# Altium footprint library TranDangKhoa-LIB.PcbLib: 1435 footprints (part 11 of 90)
Each footprint in its own frame and in the unit in brackets; x right, y up, seen from the top. Pads: shape width x height; smd on the part's side, far side on the other; paste and mask are expansions set on the pad; w line width, h text height; cw(c..) or ccw(c..) is an arc to the next point about the centre after c.
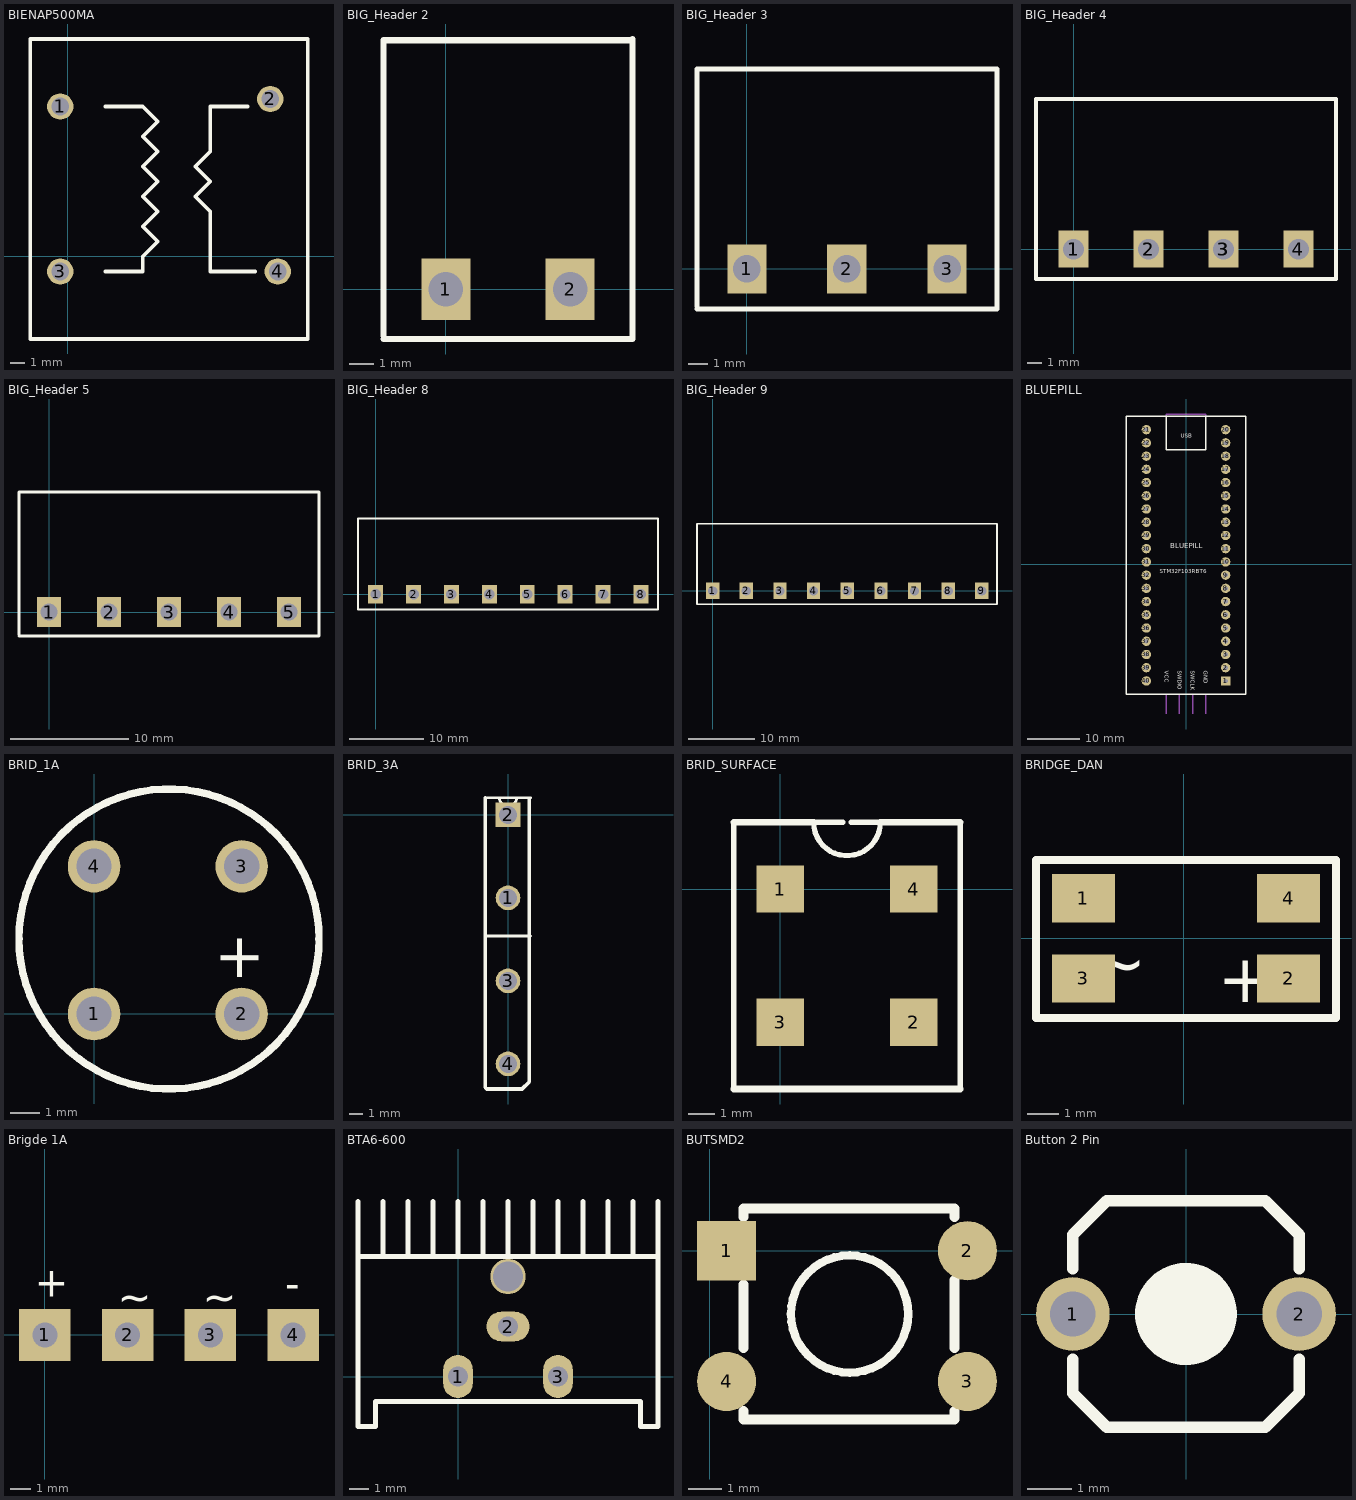
[diagram p10: the footprints below, top view; thin cyan lines are the x and y axes]

## BIENAP500MA [mil]
pads (4):
  round 70 hole 47.24 unplated: 1(-20,400) 2(540,420) 3(-20,-40) 4(560,-40)
Top Overlay:
  lines w10: 100,-40 200,-40 200,0 240,40 200,80 240,120 200,160 240,200 200,240 240,280 200,320 240,360 200,400 100,400 ; 480,400 380,400 380,280 340,240 380,200 340,160 380,120 380,-40 500,-40 ; -100,-220 640,-220 640,580 -100,580 -100,-220

## BIG_Header 2 [mm]
pads (2):
  rect 2x2.5 hole 1.4: 1(0,0) 2(5.08,0)
Top Overlay:
  lines w0.254: -2.54,-2.032 7.62,-2.032 7.62,10.211 ; -2.54,-1.905 -2.54,10.173 ; -2.54,10.16 7.62,10.16
3D body "User Library-BigHeader 5EHDR_1P.step": height 3.15, standoff -9.32, extent 2.58,-1.75 7.58,10.25
3D body "User Library-BigHeader 5EHDR_1P.step": height 3.15, standoff -9.32, extent -2.5,-1.75 2.5,10.25

## BIG_Header 3 [mm]
pads (3):
  rect 2x2.5 hole 1.4: 1(0,0) 2(5.08,0) 3(10.173,0)
Top Overlay:
  lines w0.254: -2.54,-2.032 12.713,-2.032 12.713,10.16 -2.54,10.16 -2.54,-1.905
3D body "User Library-BigHeader 5EHDR_1P.step": height 3.15, standoff -9.32, extent -2.5,-1.75 2.5,10.25
3D body "User Library-BigHeader 5EHDR_1P.step": height 3.15, standoff -9.32, extent 2.593,-1.75 7.593,10.25
3D body "User Library-BigHeader 5EHDR_1P.step": height 3.15, standoff -9.32, extent 7.673,-1.75 12.673,10.25

## BIG_Header 4 [mm]
pads (7):
  rect 2x2.5 hole 1.4: 1(0,0) 1(0,0) 2(5.08,0) 2(5.08,0) 3(10.16,0) 3(10.173,0) 4(15.24,0)
Top Overlay:
  lines w0.254: 12.713,-2.032 -2.54,-2.032 7.62,-2.032 17.78,-2.032 17.78,10.173 -2.527,10.173 -2.54,10.173 -2.54,-1.905 -2.54,10.16 ; 12.713,10.16 -2.54,10.16 ; 17.78,10.16 -2.54,10.16
3D body "User Library-BigHeader 5EHDR_1P.step": height 3.15, standoff -9.32, extent -2.5,-1.75 2.5,10.25
3D body "User Library-BigHeader 5EHDR_1P.step": height 3.15, standoff -9.32, extent 2.58,-1.75 7.58,10.25
3D body "User Library-BigHeader 5EHDR_1P.step": height 3.15, standoff -9.32, extent 7.66,-1.75 12.66,10.25
3D body "User Library-BigHeader 5EHDR_1P.step": height 3.15, standoff -9.32, extent 12.74,-1.75 17.74,10.25

## BIG_Header 5 [mm]
pads (5):
  rect 2x2.5 hole 1.4: 1(0,0) 2(5.08,0) 3(10.16,0) 4(15.24,0) 5(20.32,0)
Top Overlay:
  lines w0.254: -2.54,-2.032 7.62,-2.032 22.86,-2.032 22.86,10.16 ; -2.54,-1.905 -2.54,10.16 ; -2.54,10.16 22.86,10.16 ; -2.54,10.16 6.248,10.16 22.86,10.16
3D body "User Library-BigHeader 5EHDR_1P.step": height 3.15, standoff -9.32, extent -2.5,-1.75 2.5,10.25
3D body "User Library-BigHeader 5EHDR_1P.step": height 3.15, standoff -9.32, extent 2.58,-1.75 7.58,10.25
3D body "User Library-BigHeader 5EHDR_1P.step": height 3.15, standoff -9.32, extent 7.66,-1.75 12.66,10.25
3D body "User Library-BigHeader 5EHDR_1P.step": height 3.15, standoff -9.32, extent 12.74,-1.75 17.74,10.25
3D body "User Library-BigHeader 5EHDR_1P.step": height 3.15, standoff -9.32, extent 17.82,-1.75 22.82,10.25

## BIG_Header 8 [mm]
pads (8):
  rect 2x2.5 hole 1.4: 1(0,0) 2(5.08,0) 3(10.16,0) 4(15.24,0) 5(20.32,0) 6(25.4,0) 7(30.48,0) 8(35.56,0)
Top Overlay:
  lines w0.254: 13.843,10.16 37.846,10.16 37.846,-2.032 27.94,-2.032 17.78,-2.032 7.62,-2.032 -2.362,-2.032 -2.362,10.16 17.78,10.16
3D body "User Library-BigHeader 5EHDR_1P.step": height 3.15, standoff -9.32, extent -2.5,-1.75 2.5,10.25
3D body "User Library-BigHeader 5EHDR_1P.step": height 3.15, standoff -9.32, extent 2.58,-1.75 7.58,10.25
3D body "User Library-BigHeader 5EHDR_1P.step": height 3.15, standoff -9.32, extent 7.66,-1.75 12.66,10.25
3D body "User Library-BigHeader 5EHDR_1P.step": height 3.15, standoff -9.32, extent 12.74,-1.75 17.74,10.25
3D body "User Library-BigHeader 5EHDR_1P.step": height 3.15, standoff -9.32, extent 17.82,-1.75 22.82,10.25
3D body "User Library-BigHeader 5EHDR_1P.step": height 3.15, standoff -9.32, extent 22.9,-1.75 27.9,10.25
3D body "User Library-BigHeader 5EHDR_1P.step": height 3.15, standoff -9.32, extent 27.98,-1.75 32.98,10.25
3D body "User Library-BigHeader 5EHDR_1P.step": height 3.15, standoff -9.32, extent 33.06,-1.75 38.06,10.25

## BIG_Header 9 [mm]
pads (9):
  rect 2x2.5 hole 1.4: 1(0,0) 2(5.08,0) 3(10.16,0) 4(15.24,0) 5(20.32,0) 6(25.4,0) 7(30.48,0) 8(35.56,0) 9(40.64,0)
Top Overlay:
  lines w0.254: 13.843,10.16 42.926,10.16 42.926,-2.032 27.94,-2.032 17.78,-2.032 7.62,-2.032 -2.362,-2.032 -2.362,10.16 17.78,10.16
3D body "User Library-BigHeader 5EHDR_1P.step": height 3.15, standoff -9.32, extent -2.5,-1.75 2.5,10.25
3D body "User Library-BigHeader 5EHDR_1P.step": height 3.15, standoff -9.32, extent 2.58,-1.75 7.58,10.25
3D body "User Library-BigHeader 5EHDR_1P.step": height 3.15, standoff -9.32, extent 7.66,-1.75 12.66,10.25
3D body "User Library-BigHeader 5EHDR_1P.step": height 3.15, standoff -9.32, extent 12.74,-1.75 17.74,10.25
3D body "User Library-BigHeader 5EHDR_1P.step": height 3.15, standoff -9.32, extent 17.82,-1.75 22.82,10.25
3D body "User Library-BigHeader 5EHDR_1P.step": height 3.15, standoff -9.32, extent 22.9,-1.75 27.9,10.25
3D body "User Library-BigHeader 5EHDR_1P.step": height 3.15, standoff -9.32, extent 27.98,-1.75 32.98,10.25
3D body "User Library-BigHeader 5EHDR_1P.step": height 3.15, standoff -9.32, extent 33.06,-1.75 38.06,10.25
3D body "User Library-BigHeader 5EHDR_1P.step": height 3.15, standoff -9.32, extent 38.14,-1.75 43.14,10.25

## BLUEPILL [mm]
pads (40):
  rect 1.8x1.8 hole 0.8 paste-2539.97 mask+0.051: 1(7.622,-22.46)
  round 1.8 hole 0.8 paste-2539.97 mask+0.051: 2(7.62,-19.918) 3(7.62,-17.378) 4(7.62,-14.838) 5(7.62,-12.298) 6(7.62,-9.758) 7(7.62,-7.218) 8(7.62,-4.678) 9(7.62,-2.138) 10(7.62,0.402) 11(7.62,2.942) 12(7.62,5.482) 13(7.62,8.022) 14(7.62,10.562) 15(7.62,13.102) 16(7.62,15.642) 17(7.62,18.182) 18(7.62,20.722) 19(7.62,23.262) 20(7.62,25.802) 21(-7.62,25.802) 22(-7.62,23.262) 23(-7.62,20.722) 24(-7.62,18.182) 25(-7.62,15.642) 26(-7.62,13.102) 27(-7.62,10.562) 28(-7.62,8.022) 29(-7.618,5.48) 30(-7.62,2.942) 31(-7.62,0.402) 32(-7.62,-2.138) 33(-7.62,-4.678) 34(-7.62,-7.218) 35(-7.62,-9.758) 36(-7.62,-12.298) 37(-7.62,-14.838) 38(-7.62,-17.378) 39(-7.62,-19.918) 40(-7.62,-22.458)
Top Overlay:
  lines w0.254: -3.808,28.34 -3.808,21.99 3.812,21.99 3.812,28.34 ; -11.43,-24.998 11.43,-24.998 11.43,28.341 -11.43,28.341 -11.43,-24.998
  text "STM32F103RBT6" at -4.998,-1.797 h0.8
  text "USB" at -0.999,24.204 h0.8
  text "GND" at 3.43,-20.458 h0.8
  text "SWCLK" at 0.928,-20.46 h0.8
  text "SWDIO" at -1.572,-20.46 h0.8
  text "VCC" at -4.072,-20.461 h0.8
  text "BLUEPILL" at -3,2.995 h1
Mechanical 15:
  lines w0.254: -3.808,-28.81 -3.808,-25 ; -3.808,28.34 -3.808,28.81 3.812,28.81 3.812,28.34 ; -1.268,-28.81 -1.268,-25 ; 1.272,-28.81 1.272,-25 ; 3.812,-28.81 3.812,-25

## BRID_1A [mm]
pads (4):
  round 1.778 hole 1.2 unplated: 1(0,0) 2(5,0) 3(5,5) 4(0,5)
Top Overlay:
  circle w0.254: c2.54,2.54 r5.08
  text "+" at 5.588,1.016 h1.52

## BRID_3A [mil]
pads (4):
  round 70 hole 51.18 unplated: 1(0,-236.22) 3(0,-472.44) 4(0,-708.66)
  rect 70x70 hole 51.18 unplated: 2(0,0)
Top Overlay:
  lines w7.87: -64.37,-344.49 64.37,-344.49 ; -64.37,49.21 24.61,49.21 cw(c0,49.21) -24.61,49.21 64.37,49.21
  lines w10: -64.37,49.21 -64.37,-775.63 -60,-780 40,-780 60,-760 60,44.84

## BRID_SURFACE [mil]
pads (4):
  rect 70x70 smd: 1(0,0) 2(196.85,-196.85) 3(0,-196.85) 4(196.85,0)
Top Overlay:
  lines w7.87: -68.9,-295.28 -68.9,98.43 ; 91.93,98.43 49.21,98.43 ccw(c98.43,98.43) 147.64,98.43 104.92,98.43 ; 265.75,-295.28 265.75,98.43
  lines w10: -68.9,-295.28 265.75,-295.28 ; -68.9,98.43 49.21,98.43 ; 147.64,98.43 265.75,98.43

## BRIDGE_DAN [mm]
pads (4):
  rect 2x1.524 smd: 1(-3.175,1.27) 2(3.325,-1.27) 3(-3.175,-1.27) 4(3.325,1.27)
Top Overlay:
  lines w0.254: -4.675,-2.52 -4.675,2.48 4.825,2.48 4.825,-2.52 -4.675,-2.52
  text "~" at -2.925,-1.52 h1.52
  text "+" at 1.075,-2.02 h1.52
3D body "User Library-SOP254P665X290.STEP": height 2.9, standoff 0, extent -3.343,-2.54 3.343,2.41

## Brigde 1A [mm]
pads (4):
  rect 2.5x2.5 / inner round 1.575 / far side rect 2.5x2.5 hole 1.2: 1(0,0) 2(4,0) 3(8,0) 4(12,0)
Top Overlay:
  text "-" at 11.608,1.778 h1.43
  text "+" at -0.483,1.841 h1.43
  text "~" at 7.62,1.13 h1.43
  text "~" at 3.531,1.118 h1.43
3D body "SW3dPS-KBPM.STEP": height 16.5, standoff -7.7, extent -1.54,-2.75 13.04,2.26

## BTA6-600 [mm] "TRIAC BTA6/6A/600V"
pads (4):
  oval 1.5x2.2 hole 1: 1(0,0) 3(5.08,0)
  oval 2.2x1.5 hole 1: 2(2.54,2.54)
  round 1.8 hole 1.5: ""(2.54,5.08)
Top Overlay:
  lines w0.254: -5.08,6.096 10.16,6.096 ; -5.08,8.89 -5.08,-2.54 -4.191,-2.54 -4.191,-1.27 9.271,-1.27 9.271,-2.54 10.16,-2.54 10.16,8.89 ; -3.81,6.096 -3.81,8.89 ; -2.54,6.096 -2.54,8.89 ; -1.27,6.096 -1.27,8.89 ; 0,6.096 0,8.89 ; 1.27,6.096 1.27,8.89 ; 2.54,6.096 2.54,8.89 ; 3.81,6.096 3.81,8.89 ; 5.08,6.096 5.08,8.89 ; 6.35,6.096 6.35,8.89 ; 7.62,6.096 7.62,8.89 ; 8.89,6.096 8.89,8.89
3D body "User Library-Disipador TO.step": height 20, standoff 0, extent -5.96,2.54 11.04,12.54
3D body "User Library-TO-220-3.step": height 18.7, standoff -10.08, extent -2.41,-2.083 7.49,2.417

## BUTSMD2 [mil]
pads (4):
  rect 70x70 smd: 1(19.68,0)
  round 70 smd: 2(305.31,0) 3(305.31,-155) 4(19.68,-155)
Top Overlay:
  circle w10: c165.54,-75 r69.46
  lines w12: 40,-190 40,-200 290,-200 290,-190 ; 40,-115 40,-40 ; 40,40 40,50 290,50 290,40 ; 290,-115 290,-35
3D body: height 19.68, standoff 0, extent 274.85,-186.95 337.6,-124.08
3D body: height 19.68, standoff 0, extent -12.54,-186.94 50.2,-124.07
3D body: height 19.68, standoff 0, extent -11.81,-31.5 35.44,32.48
3D body: height 196.85, standoff 0, extent 96.1,-144.44 234.98,-5.56
3D body: height 118.11, standoff 0, extent 34,-206 296,56
3D body: height 19.68, standoff 0, extent 274.85,-31.43 337.6,31.43

## Button 2 Pin [mil] "Button 200mil 2 Pin"
pads (2):
  round 65 hole 40: 1(-100,0) 2(100,0)
Top Overlay:
  circle w50: c0,0 r20
  lines w10: -100,-40 -100,-70 -70,-100 70,-100 100,-70 100,-40 ; -100,40 -100,70 -70,100 70,100 100,70 100,40
3D body: height 118.11, standoff 0, extent -105,-105 105,105
3D body: height 196.85, standoff 0, extent -70.02,-100.02 -70.01,-100.01